# Altium footprint library Connectors.PcbLib: 245 footprints (part 3 of 18)
Each footprint in its own frame and in the unit in brackets; x right, y up, seen from the top. Pads: shape width x height; smd on the part's side, far side on the other; paste and mask are expansions set on the pad; w line width, h text height; cw(c..) or ccw(c..) is an arc to the next point about the centre after c.
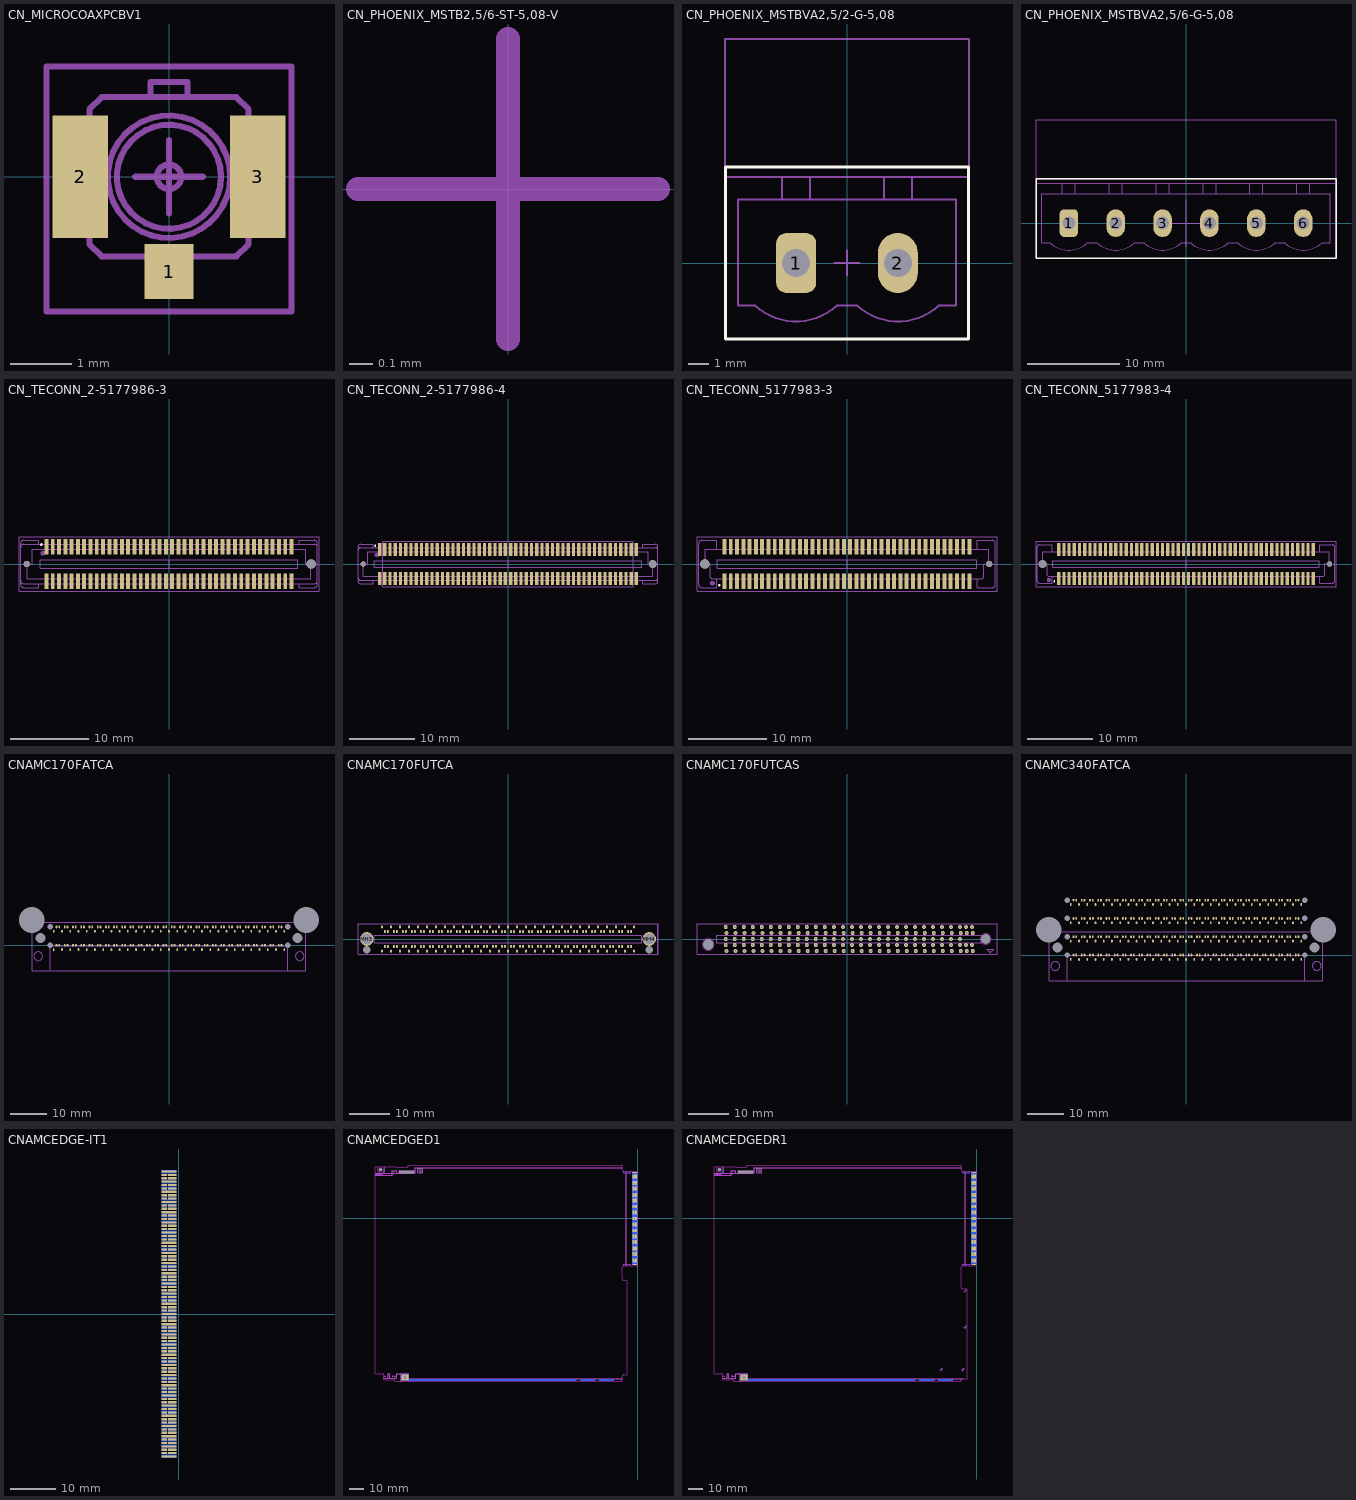
[diagram p2: the footprints below, top view; thin cyan lines are the x and y axes]

## CN_MICROCOAXPCBV1 [mm] "Micro coax pcb connector SMD"
height 2
pads (3):
  rect 0.8x0.9 smd: 1(0,-1.55)
  rect 0.9x2 smd: 2(-1.45,0) 3(1.45,0)
Mechanical 13:
  circle w0.1: c0,0 r0.2
  circle w0.1: c0,0 r1
  circle w0.1: c0,0 r0.85
  lines w0.1: -1.3,-0.9 -1.5,-0.9 -1.5,0.9 -1.3,0.9 ; -0.3,-1.3 -0.3,-1.55 0.3,-1.55 0.3,-1.3 ; -0.3,1.3 -0.3,1.55 0.3,1.55 0.3,1.3 ; 1.3,-0.9 1.5,-0.9 1.5,0.9 1.3,0.9 ; -1.3,-1.1 -1.3,1.1 -1.1,1.3 1.1,1.3 1.3,1.1 1.3,-1.1 1.1,-1.3 -1.1,-1.3 -1.3,-1.1
Mechanical 15:
  lines w0.102: -0.55,0 0.55,0 ; 0,-0.6 0,0.6 ; -2,-2.2 2,-2.2 2,1.8 -2,1.8 -2,-2.2
3D body: height 0.18, standoff 0, extent 1.3,-0.9 1.5,0.9
3D body: height 0.18, standoff 0, extent -1.5,-0.9 -1.3,0.9
3D body: height 1.25, standoff 0.35, extent -0.204,-0.204 0.204,0.204
3D body: height 1.25, standoff 0.35, extent -1.009,-1.009 1.009,1.009
3D body: height 0.35, standoff 0, extent -1.3,-1.3 1.3,1.3
3D body: height 0.18, standoff 0, extent -0.3,-1.55 0.3,-1.3
3D body: height 0.53, standoff 0.35, extent -0.3,0.95 0.3,1.55

## CN_PHOENIX_MSTB2,5/6-ST-5,08-V [mm] "MSTB2,5/5-ST-5,08  5pin PLUG vert"
Mechanical 15:
  lines w0.102: -0.635,0 0.635,0 ; 0,-0.635 0,0.635
3D body: height 21.95, standoff 3.75, extent -15.24,-3.8 15.24,11.2

## CN_PHOENIX_MSTBVA2,5/2-G-5,08 [mm] "MSTBVA2,5/2-G-5,08  2pin vertical"
pads (2):
  rrect50% 2x3 hole 1.4: 1(-2.54,0)
  oval 2x3 hole 1.4: 2(2.54,0)
Top Overlay:
  lines w0.15: -6.08,-3.8 -6.08,4.8 6.08,4.8 6.08,-3.8 -6.08,-3.8
Mechanical 13:
  lines w0.1: -6.1,4.3 6.096,4.3 ; -5.461,-2.125 -4.582,-2.125 ; -4.582,-2.132 ccw(c-2.55,0.075) -0.518,-2.132 ; -3.25,3.175 -3.25,4.3 ; -1.85,3.175 -1.85,4.3 ; -0.518,-2.125 0.518,-2.125 ; 0.518,-2.132 ccw(c2.55,0.075) 4.582,-2.132 ; 1.85,3.175 1.85,4.3 ; 3.25,3.175 3.25,4.3 ; 4.582,-2.125 5.461,-2.125 ; -3.04,-0.5 -3.04,0.5 -2.04,0.5 -2.04,-0.5 -3.04,-0.5 ; 2.04,-0.5 2.04,0.5 3.04,0.5 3.04,-0.5 2.04,-0.5
  lines w0.102: -5.461,-2.125 -5.461,3.175 5.461,3.175 5.461,-2.125 ; -6.08,-3.8 6.08,-3.8 6.08,4.8 -6.08,4.8 -6.08,-3.8
Mechanical 15:
  lines w0.1: -6.1,4.82 -6.1,11.2 6.1,11.2 6.1,4.82
  lines w0.102: -0.635,0 0.635,0 ; 0,-0.635 0,0.635
3D body: height 12.02, standoff -3.88, extent -6.08,-3.8 6.08,4.8

## CN_PHOENIX_MSTBVA2,5/6-G-5,08 [mm] "MSTBVA2,5/6-G-5,08  6pin vertical"
pads (6):
  rrect50% 2x3 hole 1.4: 1(-12.7,0)
  oval 2x3 hole 1.4: 2(-7.62,0) 3(-2.54,0) 4(2.54,0) 5(7.62,0) 6(12.7,0)
Top Overlay:
  lines w0.15: -16.256,-3.8 -16.256,4.8 16.256,4.8 16.256,-3.8 -16.256,-3.8
Mechanical 13:
  lines w0.1: -16.26,4.3 16.24,4.3 ; -15.621,-2.125 -14.742,-2.125 ; -14.742,-2.132 ccw(c-12.71,0.075) -10.678,-2.132 ; -13.41,3.175 -13.41,4.3 ; -12.01,3.175 -12.01,4.3 ; -10.678,-2.125 -9.642,-2.125 ; -9.642,-2.132 ccw(c-7.61,0.075) -5.578,-2.132 ; -8.31,3.175 -8.31,4.3 ; -6.91,3.175 -6.91,4.3 ; -5.598,-2.125 -4.562,-2.125 ; -4.562,-2.132 ccw(c-2.53,0.075) -0.498,-2.132 ; -3.23,3.175 -3.23,4.3 ; -1.83,3.175 -1.83,4.3 ; -0.518,-2.125 0.518,-2.125 ; 0.518,-2.132 ccw(c2.55,0.075) 4.582,-2.132 ; 1.85,3.175 1.85,4.3 ; 3.25,3.175 3.25,4.3 ; 4.562,-2.125 5.598,-2.125 ; 5.598,-2.132 ccw(c7.63,0.075) 9.662,-2.132 ; 6.93,3.175 6.93,4.3 ; 8.33,3.175 8.33,4.3 ; 9.642,-2.125 10.678,-2.125 ; 10.678,-2.132 ccw(c12.71,0.075) 14.742,-2.132 ; 12.01,3.175 12.01,4.3 ; 13.41,3.175 13.41,4.3 ; 14.742,-2.125 15.621,-2.125 ; -13.2,-0.5 -13.2,0.5 -12.2,0.5 -12.2,-0.5 -13.2,-0.5 ; -8.12,-0.5 -8.12,0.5 -7.12,0.5 -7.12,-0.5 -8.12,-0.5 ; -3.04,-0.5 -2.04,-0.5 -2.04,0.5 -3.04,0.5 -3.04,-0.5 ; 2.04,-0.5 2.04,0.5 3.04,0.5 3.04,-0.5 2.04,-0.5 ; 7.12,-0.5 8.12,-0.5 8.12,0.5 7.12,0.5 7.12,-0.5 ; 12.2,-0.5 12.2,0.5 13.2,0.5 13.2,-0.5 12.2,-0.5
  lines w0.102: -15.621,-2.125 -15.621,3.175 15.621,3.175 15.621,-2.125 ; -16.24,-3.8 16.24,-3.8 16.24,4.8 -16.24,4.8 -16.24,-3.8
Mechanical 15:
  lines w0.1: -16.256,4.82 -16.256,11.2 16.256,11.2 16.256,4.82
  lines w0.102: -1.905,0 1.905,0 ; 0,-2.54 0,2.54
3D body: height 12.02, standoff -3.88, extent -16.24,-3.8 16.24,4.8

## CN_TECONN_2-5177986-3 [mm] "0.8mm Pitch Stacking Height 6.6mm Header-Stacking Connector male"
height 6.6
pads (82):
  rect 0.5x2 smd: 1(-15.6,2.2) 2(-15.6,-2.2) 3(-14.8,2.2) 4(-14.8,-2.2) 5(-14,2.2) 6(-14,-2.2) 7(-13.2,2.2) 8(-13.2,-2.2) 9(-12.4,2.2) 10(-12.4,-2.2) 11(-11.6,2.2) 12(-11.6,-2.2) 13(-10.8,2.2) 14(-10.8,-2.2) 15(-10,2.2) 16(-10,-2.2) 17(-9.2,2.2) 18(-9.2,-2.2) 19(-8.4,2.2) 20(-8.4,-2.2) 21(-7.6,2.2) 22(-7.6,-2.2) 23(-6.8,2.2) 24(-6.8,-2.2) 25(-6,2.2) 26(-6,-2.2) 27(-5.2,2.2) 28(-5.2,-2.2) 29(-4.4,2.2) 30(-4.4,-2.2) 31(-3.6,2.2) 32(-3.6,-2.2) 33(-2.8,2.2) 34(-2.8,-2.2) 35(-2,2.2) 36(-2,-2.2) 37(-1.2,2.2) 38(-1.2,-2.2) 39(-0.4,2.2) 40(-0.4,-2.2) 41(0.4,2.2) 42(0.4,-2.2) 43(1.2,2.2) 44(1.2,-2.2) 45(2,2.2) 46(2,-2.2) 47(2.8,2.2) 48(2.8,-2.2) 49(3.6,2.2) 50(3.6,-2.2) 51(4.4,2.2) 52(4.4,-2.2) 53(5.2,2.2) 54(5.2,-2.2) 55(6,2.2) 56(6,-2.2) 57(6.8,2.2) 58(6.8,-2.2) 59(7.6,2.2) 60(7.6,-2.2) 61(8.4,2.2) 62(8.4,-2.2) 63(9.2,2.2) 64(9.2,-2.2) 65(10,2.2) 66(10,-2.2) 67(10.8,2.2) 68(10.8,-2.2) 69(11.6,2.2) 70(11.6,-2.2) 71(12.4,2.2) 72(12.4,-2.2) 73(13.2,2.2) 74(13.2,-2.2) 75(14,2.2) 76(14,-2.2) 77(14.8,2.2) 78(14.8,-2.2) 79(15.6,2.2) 80(15.6,-2.2)
  round 0.79 hole 0.8 unplated: MH1(-18.1,0)
  round 1.19 hole 1.2 unplated: MH2(18.1,0)
Top Overlay:
  circle w0.178: c-16.249,2.475 r0.074
Mechanical 13:
  circle w0.381: c-16.05,1.375 r0.125
  lines w0.1: -18.9,-2.1 ccw(c-18.5,-2.1) -18.5,-2.5 18.5,-2.5 ; -18.9,2.1 cw(c-18.5,2.1) -18.5,2.5 18.5,2.5 cw(c18.5,2.1) 18.9,2.1 ; -18.075,-1.9 18.075,-1.9 ; -17.4,1.9 17.4,1.9 ; -16.6,-2.5 -16.6,-3 -18.5,-3 cw(c-18.5,-2.6) -18.9,-2.6 -18.9,2.6 cw(c-18.5,2.6) -18.5,3 -16.6,3 -16.6,2.5 ; 16.4,-0.525 16.4,0.525 -16.4,0.525 -16.4,-0.525 16.4,-0.525 ; 16.6,-2.5 16.6,-3.001 18.5,-3.001 ccw(c18.5,-2.6) 18.9,-2.6 18.9,2.6 ccw(c18.5,2.6) 18.5,3 16.6,3 16.6,2.5 ; 18.5,-2.5 ccw(c18.5,-2.1) 18.9,-2.1
  lines w0.102: -18.075,-1.9 -18.075,0 -17.4,0 -17.4,1.9 ; 17.4,1.9 17.4,0 18.075,0 18.075,-1.9
Mechanical 15:
  lines w0.102: 0,-0.5 0,0.5 ; -19.1,-3.5 19.1,-3.5 19.1,3.5 -19.1,3.5 -19.1,-3.5
3D body: height 6.62, standoff -0.98, extent -18.9,-3 18.9,3

## CN_TECONN_2-5177986-4 [mm] "100pin 0.8mm Pitch Stacking Height 6.6mm Header-Stacking Connector male"
height 6.6
pads (102):
  rect 0.5x2 smd: 1(-19.6,2.2) 2(-19.6,-2.2) 3(-18.8,2.2) 4(-18.8,-2.2) 5(-18,2.2) 6(-18,-2.2) 7(-17.2,2.2) 8(-17.2,-2.2) 9(-16.4,2.2) 10(-16.4,-2.2) 11(-15.6,2.2) 12(-15.6,-2.2) 13(-14.8,2.2) 14(-14.8,-2.2) 15(-14,2.2) 16(-14,-2.2) 17(-13.2,2.2) 18(-13.2,-2.2) 19(-12.4,2.2) 20(-12.4,-2.2) 21(-11.6,2.2) 22(-11.6,-2.2) 23(-10.8,2.2) 24(-10.8,-2.2) 25(-10,2.2) 26(-10,-2.2) 27(-9.2,2.2) 28(-9.2,-2.2) 29(-8.4,2.2) 30(-8.4,-2.2) 31(-7.6,2.2) 32(-7.6,-2.2) 33(-6.8,2.2) 34(-6.8,-2.2) 35(-6,2.2) 36(-6,-2.2) 37(-5.2,2.2) 38(-5.2,-2.2) 39(-4.4,2.2) 40(-4.4,-2.2) 41(-3.6,2.2) 42(-3.6,-2.2) 43(-2.8,2.2) 44(-2.8,-2.2) 45(-2,2.2) 46(-2,-2.2) 47(-1.2,2.2) 48(-1.2,-2.2) 49(-0.4,2.2) 50(-0.4,-2.2) 51(0.4,2.2) 52(0.4,-2.2) 53(1.2,2.2) 54(1.2,-2.2) 55(2,2.2) 56(2,-2.2) 57(2.8,2.2) 58(2.8,-2.2) 59(3.6,2.2) 60(3.6,-2.2) 61(4.4,2.2) 62(4.4,-2.2) 63(5.2,2.2) 64(5.2,-2.2) 65(6,2.2) 66(6,-2.2) 67(6.8,2.2) 68(6.8,-2.2) 69(7.6,2.2) 70(7.6,-2.2) 71(8.4,2.2) 72(8.4,-2.2) 73(9.2,2.2) 74(9.2,-2.2) 75(10,2.2) 76(10,-2.2) 77(10.8,2.2) 78(10.8,-2.2) 79(11.6,2.2) 80(11.6,-2.2) 81(12.4,2.2) 82(12.4,-2.2) 83(13.2,2.2) 84(13.2,-2.2) 85(14,2.2) 86(14,-2.2) 87(14.8,2.2) 88(14.8,-2.2) 89(15.6,2.2) 90(15.6,-2.2) 91(16.4,2.2) 92(16.4,-2.2) 93(17.2,2.2) 94(17.2,-2.2) 95(18,2.2) 96(18,-2.2) 97(18.8,2.2) 98(18.8,-2.2) 99(19.6,2.2) 100(19.6,-2.2)
  round 0.79 hole 0.8 unplated: MH1(-22.1,0)
  round 1.19 hole 1.2 unplated: MH2(22.1,0)
Top Overlay:
  circle w0.178: c-20.274,2.8 r0.074
Mechanical 13:
  circle w0.381: c-20.05,1.375 r0.125
  lines w0.1: -22.9,-2.1 ccw(c-22.5,-2.1) -22.5,-2.5 22.5,-2.5 ccw(c22.5,-2.1) 22.9,-2.1 ; -22.9,2.1 cw(c-22.5,2.1) -22.5,2.5 22.5,2.5 cw(c22.5,2.1) 22.9,2.1 ; -22.5,-3 -20.6,-3 -20.6,-2.5 ; -22.5,-3 cw(c-22.5,-2.6) -22.9,-2.6 -22.9,2.6 cw(c-22.5,2.6) -22.5,3 -20.6,3 -20.6,2.5 ; -22.075,-1.9 22.075,-1.9 ; -21.4,1.9 21.4,1.9 ; 20.4,-0.525 20.4,0.525 -20.4,0.525 -20.4,-0.525 20.4,-0.525 ; 20.6,-2.5 20.6,-3.001 22.5,-3.001 ccw(c22.5,-2.601) 22.9,-2.601 22.9,2.6 ccw(c22.5,2.6) 22.5,3 20.6,3 20.6,2.5
  lines w0.102: -22.075,-1.9 -22.075,0 -21.4,0 -21.4,1.9 ; 21.4,1.9 21.4,0 22.075,0 22.075,-1.9
Mechanical 15:
  lines w0.102: 0,-0.5 0,0.5 ; -19.1,-3.5 -19.1,3.5 19.1,3.5 19.1,-3.5 -19.1,-3.5
3D body: height 6.62, standoff -0.98, extent -22.9,-3 22.9,3

## CN_TECONN_5177983-3 [mm] "0.8mm Pitch Stacking Height 6mm Header-Stacking Connector female"
height 6
pads (82):
  rect 0.5x2 smd: 1(-15.6,-2.2) 2(-15.6,2.2) 3(-14.8,-2.2) 4(-14.8,2.2) 5(-14,-2.2) 6(-14,2.2) 7(-13.2,-2.2) 8(-13.2,2.2) 9(-12.4,-2.2) 10(-12.4,2.2) 11(-11.6,-2.2) 12(-11.6,2.2) 13(-10.8,-2.2) 14(-10.8,2.2) 15(-10,-2.2) 16(-10,2.2) 17(-9.2,-2.2) 18(-9.2,2.2) 19(-8.4,-2.2) 20(-8.4,2.2) 21(-7.6,-2.2) 22(-7.6,2.2) 23(-6.8,-2.2) 24(-6.8,2.2) 25(-6,-2.2) 26(-6,2.2) 27(-5.2,-2.2) 28(-5.2,2.2) 29(-4.4,-2.2) 30(-4.4,2.2) 31(-3.6,-2.2) 32(-3.6,2.2) 33(-2.8,-2.2) 34(-2.8,2.2) 35(-2,-2.2) 36(-2,2.2) 37(-1.2,-2.2) 38(-1.2,2.2) 39(-0.4,-2.2) 40(-0.4,2.2) 41(0.4,-2.2) 42(0.4,2.2) 43(1.2,-2.2) 44(1.2,2.2) 45(2,-2.2) 46(2,2.2) 47(2.8,-2.2) 48(2.8,2.2) 49(3.6,-2.2) 50(3.6,2.2) 51(4.4,-2.2) 52(4.4,2.2) 53(5.2,-2.2) 54(5.2,2.2) 55(6,-2.2) 56(6,2.2) 57(6.8,-2.2) 58(6.8,2.2) 59(7.6,-2.2) 60(7.6,2.2) 61(8.4,-2.2) 62(8.4,2.2) 63(9.2,-2.2) 64(9.2,2.2) 65(10,-2.2) 66(10,2.2) 67(10.8,-2.2) 68(10.8,2.2) 69(11.6,-2.2) 70(11.6,2.2) 71(12.4,-2.2) 72(12.4,2.2) 73(13.2,-2.2) 74(13.2,2.2) 75(14,-2.2) 76(14,2.2) 77(14.8,-2.2) 78(14.8,2.2) 79(15.6,-2.2) 80(15.6,2.2)
  round 0.79 hole 0.8 unplated: MH1(18.1,0)
  round 1.19 hole 1.2 unplated: MH2(-18.1,0)
Top Overlay:
  circle w0.178: c-16.274,-2.725 r0.074
Mechanical 13:
  circle w0.381: c-17.125,-2.45 r0.125
  lines w0.1: 16.599,-1.9 16.599,-3 18.499,-3 ccw(c18.5,-2.6) 18.9,-2.6 18.9,2.6 ccw(c18.5,2.6) 18.5,3 16.6,3 16.6,1.9 -16.6,1.9 -16.6,3 -18.5,3 ccw(c-18.5,2.6) -18.9,2.6 -18.9,-2.6 ccw(c-18.5,-2.6) -18.5,-3 -16.6,-3 -16.6,-1.9 16.6,-1.9 ; -16.525,-0.525 -16.525,0.525 16.525,0.525 16.525,-0.525 -16.525,-0.525
  lines w0.102: -16.6,-1.9 -17.2,-1.9 -17.4,-1.7 -17.4,0 -18.075,0 -18.075,1.9 -16.6,1.9 ; 16.599,-1.9 17.199,-1.9 17.4,-1.7 17.4,0 18.075,0 18.075,1.9 16.6,1.9
Mechanical 15:
  lines w0.102: 0,-0.5 0,0.5 ; -19.1,-3.5 19.1,-3.5 19.1,3.5 -19.1,3.5 -19.1,-3.5
3D body: height 3.77, standoff -0.78, extent -18.9,-3 18.9,3

## CN_TECONN_5177983-4 [mm] "100pin 0.8mm Pitch Stacking Height 6mm Header-Stacking Connector female"
height 6
pads (102):
  rect 0.5x2 smd: 1(-19.6,-2.2) 2(-19.6,2.2) 3(-18.8,-2.2) 4(-18.8,2.2) 5(-18,-2.2) 6(-18,2.2) 7(-17.2,-2.2) 8(-17.2,2.2) 9(-16.4,-2.2) 10(-16.4,2.2) 11(-15.6,-2.2) 12(-15.6,2.2) 13(-14.8,-2.2) 14(-14.8,2.2) 15(-14,-2.2) 16(-14,2.2) 17(-13.2,-2.2) 18(-13.2,2.2) 19(-12.4,-2.2) 20(-12.4,2.2) 21(-11.6,-2.2) 22(-11.6,2.2) 23(-10.8,-2.2) 24(-10.8,2.2) 25(-10,-2.2) 26(-10,2.2) 27(-9.2,-2.2) 28(-9.2,2.2) 29(-8.4,-2.2) 30(-8.4,2.2) 31(-7.6,-2.2) 32(-7.6,2.2) 33(-6.8,-2.2) 34(-6.8,2.2) 35(-6,-2.2) 36(-6,2.2) 37(-5.2,-2.2) 38(-5.2,2.2) 39(-4.4,-2.2) 40(-4.4,2.2) 41(-3.6,-2.2) 42(-3.6,2.2) 43(-2.8,-2.2) 44(-2.8,2.2) 45(-2,-2.2) 46(-2,2.2) 47(-1.2,-2.2) 48(-1.2,2.2) 49(-0.4,-2.2) 50(-0.4,2.2) 51(0.4,-2.2) 52(0.4,2.2) 53(1.2,-2.2) 54(1.2,2.2) 55(2,-2.2) 56(2,2.2) 57(2.8,-2.2) 58(2.8,2.2) 59(3.6,-2.2) 60(3.6,2.2) 61(4.4,-2.2) 62(4.4,2.2) 63(5.2,-2.2) 64(5.2,2.2) 65(6,-2.2) 66(6,2.2) 67(6.8,-2.2) 68(6.8,2.2) 69(7.6,-2.2) 70(7.6,2.2) 71(8.4,-2.2) 72(8.4,2.2) 73(9.2,-2.2) 74(9.2,2.2) 75(10,-2.2) 76(10,2.2) 77(10.8,-2.2) 78(10.8,2.2) 79(11.6,-2.2) 80(11.6,2.2) 81(12.4,-2.2) 82(12.4,2.2) 83(13.2,-2.2) 84(13.2,2.2) 85(14,-2.2) 86(14,2.2) 87(14.8,-2.2) 88(14.8,2.2) 89(15.6,-2.2) 90(15.6,2.2) 91(16.4,-2.2) 92(16.4,2.2) 93(17.2,-2.2) 94(17.2,2.2) 95(18,-2.2) 96(18,2.2) 97(18.8,-2.2) 98(18.8,2.2) 99(19.6,-2.2) 100(19.6,2.2)
  round 0.79 hole 0.8 unplated: MH1(22.1,0)
  round 1.19 hole 1.2 unplated: MH2(-22.1,0)
Top Overlay:
  circle w0.178: c-20.274,-2.675 r0.074
Mechanical 13:
  circle w0.381: c-21.125,-2.45 r0.125
  lines w0.1: -22.9,-2.6 -22.9,2.6 ; -22.9,-2.6 ccw(c-22.5,-2.6) -22.5,-3 -20.6,-3 -20.6,-1.9 20.6,-1.9 20.6,-3 22.5,-3 ccw(c22.5,-2.6) 22.9,-2.6 22.9,2.6 ccw(c22.5,2.6) 22.5,3 20.6,3 20.6,1.9 -20.6,1.9 -20.6,3 -22.5,3 ccw(c-22.5,2.6) -22.9,2.6 ; -20.525,-0.525 -20.525,0.525 20.525,0.525 20.525,-0.525 -20.525,-0.525
  lines w0.102: -20.6,-1.9 -21.2,-1.9 -21.4,-1.7 -21.4,0 -22.075,0 -22.075,1.9 -20.6,1.9 ; 20.6,-1.9 21.199,-1.9 21.4,-1.7 21.4,0 22.075,0 22.075,1.9 20.6,1.9
Mechanical 15:
  lines w0.102: 0,-0.5 0,0.5 ; -23.1,-3.5 23.1,-3.5 23.1,3.5 -23.1,3.5 -23.1,-3.5
3D body: height 3.77, standoff -0.78, extent -22.9,-3 22.9,3

## CNAMC170FATCA [mm] "AMC ATCA 170 pin horizontal"
height 12.9
pads (178):
  oval 0.48x0.75 smd paste-1: 1(31.5,-1.2) 2(30.75,0) 3(30,0) 4(29.25,-1.2) 5(28.5,0) 6(27.75,0) 7(27,-1.2) 8(26.25,0) 9(25.5,0) 10(24.75,-1.2) 11(24,0) 12(23.25,0) 13(22.5,-1.2) 14(21.75,0) 15(21,0) 16(20.25,-1.2) 17(19.5,0) 18(18.75,0) 19(18,-1.2) 20(17.25,0) 21(16.5,0) 22(15.75,-1.2) 23(15,0) 24(14.25,0) 25(13.5,-1.2) 26(12.75,0) 27(12,0) 28(11.25,-1.2) 29(10.5,0) 30(9.75,0) 31(9,-1.2) 32(8.25,0) 33(7.5,0) 34(6.75,-1.2) 35(6.05,0) 36(5.25,0) 37(4.5,-1.2) 38(3.75,0) 39(3,0) 40(2.25,-1.2) 41(1.5,0) 42(0.75,0) 43(0,-1.2) 44(-0.75,0) 45(-1.5,0) 46(-2.25,-1.2) 47(-3,0) 48(-3.75,0) 49(-4.5,-1.2) 50(-5.25,0) 51(-6,0) 52(-6.75,-1.2) 53(-7.5,0) 54(-8.25,0) 55(-9,-1.2) 56(-9.75,0) 57(-10.5,0) 58(-11.25,-1.2) 59(-12,0) 60(-12.75,0) 61(-13.5,-1.2) 62(-14.25,0) 63(-15,0) 64(-15.75,-1.2) 65(-16.5,0) 66(-17.25,0) 67(-18,-1.2) 68(-18.75,0) 69(-19.5,0) 70(-20.25,-1.2) 71(-21,0) 72(-21.75,0) 73(-22.5,-1.2) 74(-23.25,0) 75(-24,0) 76(-24.75,-1.2) 77(-25.45,0) 78(-26.25,0) 79(-27,-1.2) 80(-27.75,0) 81(-28.5,0) 82(-29.25,-1.2) 83(-30,0) 84(-30.75,0) 85(-31.5,-1.2) 86(-31.5,3.8) 87(-30.75,5) 88(-30,5) 89(-29.25,3.8) 90(-28.5,5) 91(-27.75,5) 92(-27,3.8) 93(-26.25,5) 94(-25.5,5) 95(-24.75,3.8) 96(-24,5) 97(-23.25,5) 98(-22.5,3.8) 99(-21.75,5) 100(-21,5) 101(-20.25,3.8) 102(-19.5,5) 103(-18.75,5) 104(-18,3.8) 105(-17.25,5) 106(-16.5,5) 107(-15.75,3.8) 108(-15,5) 109(-14.25,5) 110(-13.5,3.8) 111(-12.75,5) 112(-12,5) 113(-11.25,3.8) 114(-10.5,5) 115(-9.75,5) 116(-9,3.8) 117(-8.25,5) 118(-7.5,5) 119(-6.75,3.8) 120(-6,5) 121(-5.25,5) 122(-4.5,3.8) 123(-3.75,5) 124(-3,5) 125(-2.25,3.8) 126(-1.5,5) 127(-0.75,5) 128(-0.025,3.8) 129(0.75,5) 130(1.5,5) 131(2.25,3.8) 132(3,5) 133(3.75,5) 134(4.5,3.8) 135(5.25,5) 136(6,5) 137(6.75,3.8) 138(7.5,5) 139(8.25,5) 140(9,3.8) 141(9.75,5) 142(10.5,5) 143(11.25,3.8) 144(12,5) 145(12.75,5) 146(13.5,3.8) 147(14.25,5) 148(15,5) 149(15.75,3.8) 150(16.5,5) 151(17.25,5) 152(18,3.8) 153(18.75,5) 154(19.5,5) 155(20.25,3.8) 156(21,5) 157(21.75,5) 158(22.5,3.8) 159(23.25,5) 160(24,5) 161(24.75,3.8) 162(25.5,5) 163(26.25,5) 164(27,3.8) 165(27.75,5) 166(28.5,5) 167(29.25,3.8) 168(30,5) 169(30.75,5) 170(31.5,3.8)
  round 0 hole 1.5 unplated mask+0.2: MH1(-32.5,0) MH2(32.5,0) MH3(-32.5,5) MH4(32.5,5)
  round 0 hole 2.7 unplated mask+0.2: MH5(-35.15,2) MH6(35.15,2)
  round 0 hole 7 unplated mask+0.3: MH7(37.5,6.9) MH8(-37.5,6.9)
Mechanical 13:
  circle w0.1: c-35.75,-3 r1.2
  circle w0.1: c35.75,-3 r1.2
  lines w0.1: -37.401,3.652 ccw(c-37.5,6.9) -37.4,10.148 ; -37.4,5.55 -37.4,-7 37.4,-7 37.4,5.55 ; -37.4,5.554 ccw(c-37.5,6.9) -37.4,8.246 ; -37.4,8.25 -37.4,10.15 ; -34.3,6.3 34.3,6.3 ; 37.4,3.652 cw(c37.5,6.9) 37.4,10.148 ; 37.4,5.554 cw(c37.5,6.9) 37.4,8.246 ; 37.4,8.25 37.4,10.15
Mechanical 15:
  lines w0.1: -32.5,-7 -32.5,-0.1 32.5,-0.1 32.5,-7
  text "DAUGHTER BOARD" at -5.95,-1.3 h0.8
3D body: height 22.5, standoff 21.85, extent 34.55,-4.2 36.95,-1.8
3D body: height 8.25, standoff -5.8, extent -37.4,3.675 -34.25,10.148
3D body: height 17, standoff 0, extent -37.401,-7 37.4,6.3
3D body: height 8.25, standoff -5.8, extent 34.25,3.679 37.401,10.152
3D body: height 22.5, standoff 21.85, extent -36.95,-4.2 -34.55,-1.8
3D body: height 18.9, standoff 17, extent -37.401,-7 37.4,6.3
3D body: height 21.85, standoff 18.9, extent -37.401,-7 37.4,6.3

## CNAMC170FUTCA [mm] "AMC uTCA 170 pin vertical"
height 12.9
pads (174):
  oval 0.48x0.75 smd paste-1: 1(31.5,-3.05) 2(30.75,-1.85) 3(30,-1.85) 4(29.25,-3.05) 5(28.5,-1.85) 6(27.75,-1.85) 7(27,-3.05) 8(26.25,-1.85) 9(25.5,-1.85) 10(24.75,-3.05) 11(24,-1.85) 12(23.25,-1.85) 13(22.5,-3.05) 14(21.75,-1.85) 15(21,-1.85) 16(20.25,-3.05) 17(19.5,-1.85) 18(18.75,-1.85) 19(18,-3.05) 20(17.25,-1.85) 21(16.5,-1.85) 22(15.75,-3.05) 23(15,-1.85) 24(14.25,-1.85) 25(13.5,-3.05) 26(12.75,-1.85) 27(12,-1.85) 28(11.25,-3.05) 29(10.5,-1.85) 30(9.75,-1.85) 31(9,-3.05) 32(8.25,-1.85) 33(7.5,-1.85) 34(6.75,-3.05) 35(6.05,-1.85) 36(5.25,-1.85) 37(4.5,-3.05) 38(3.75,-1.85) 39(3,-1.85) 40(2.25,-3.05) 41(1.5,-1.85) 42(0.75,-1.85) 43(0,-3.05) 44(-0.75,-1.85) 45(-1.5,-1.85) 46(-2.25,-3.05) 47(-3,-1.85) 48(-3.75,-1.85) 49(-4.5,-3.05) 50(-5.25,-1.85) 51(-6,-1.85) 52(-6.75,-3.05) 53(-7.5,-1.85) 54(-8.25,-1.85) 55(-9,-3.05) 56(-9.75,-1.85) 57(-10.5,-1.85) 58(-11.25,-3.05) 59(-12,-1.85) 60(-12.75,-1.85) 61(-13.5,-3.05) 62(-14.25,-1.85) 63(-15,-1.85) 64(-15.75,-3.05) 65(-16.5,-1.85) 66(-17.25,-1.85) 67(-18,-3.05) 68(-18.75,-1.85) 69(-19.5,-1.85) 70(-20.25,-3.05) 71(-21,-1.85) 72(-21.75,-1.85) 73(-22.5,-3.05) 74(-23.25,-1.85) 75(-24,-1.85) 76(-24.75,-3.05) 77(-25.45,-1.85) 78(-26.25,-1.85) 79(-27,-3.05) 80(-27.75,-1.85) 81(-28.5,-1.85) 82(-29.25,-3.05) 83(-30,-1.85) 84(-30.75,-1.85) 85(-31.5,-3.05) 86(-31.5,3.05) 87(-30.75,1.85) 88(-30,1.85) 89(-29.25,3.05) 90(-28.5,1.85) 91(-27.75,1.85) 92(-27,3.05) 93(-26.25,1.85) 94(-25.5,1.85) 95(-24.75,3.05) 96(-24,1.85) 97(-23.25,1.85) 98(-22.5,3.05) 99(-21.75,1.85) 100(-21,1.85) 101(-20.25,3.05) 102(-19.5,1.85) 103(-18.75,1.85) 104(-18,3.05) 105(-17.25,1.85) 106(-16.5,1.85) 107(-15.75,3.05) 108(-15,1.85) 109(-14.25,1.85) 110(-13.5,3.05) 111(-12.75,1.85) 112(-12,1.85) 113(-11.25,3.05) 114(-10.5,1.85) 115(-9.75,1.85) 116(-9,3.05) 117(-8.25,1.85) 118(-7.5,1.85) 119(-6.75,3.05) 120(-6,1.85) 121(-5.25,1.85) 122(-4.5,3.05) 123(-3.75,1.85) 124(-3,1.85) 125(-2.25,3.05) 126(-1.5,1.85) 127(-0.75,1.85) 128(0,3.05) 129(0.75,1.85) 130(1.5,1.85) 131(2.25,3.05) 132(3,1.85) 133(3.75,1.85) 134(4.5,3.05) 135(5.25,1.85) 136(6,1.85) 137(6.75,3.05) 138(7.5,1.85) 139(8.25,1.85) 140(9,3.05) 141(9.75,1.85) 142(10.5,1.85) 143(11.25,3.05) 144(12,1.85) 145(12.75,1.85) 146(13.5,3.05) 147(14.25,1.85) 148(15,1.85) 149(15.75,3.05) 150(16.5,1.85) 151(17.25,1.85) 152(18,3.05) 153(18.75,1.85) 154(19.5,1.85) 155(20.25,3.025) 156(21,1.85) 157(21.75,1.85) 158(22.5,3.05) 159(23.25,1.85) 160(24,1.85) 161(24.75,3.05) 162(25.5,1.85) 163(26.25,1.85) 164(27,3.05) 165(27.75,1.85) 166(28.5,1.85) 167(29.25,3.05) 168(30,1.85) 169(30.75,1.85) 170(31.5,3.05)
  round 0 hole 1.8 unplated mask+1: MH1(-35.25,-2.7) MH2(35.25,-2.7)
  round 3.4 hole 2.8: MH3(-35.25,0) MH4(35.25,0)
Mechanical 13:
  lines w0.1: -37.4,-3.75 37.4,-3.75 ; -37.4,3.75 37.4,3.75 ; -33.401,-0.95 33.401,-0.95 33.401,0.95 -33.401,0.95 -33.401,-0.95
  lines w0.102: -37.4,-3.75 -37.4,3.75 ; 37.4,-3.75 37.4,3.75
Mechanical 14:
  lines w0.102: -37.45,-3.75 37.45,-3.75 37.45,3.75 -37.45,3.75 -37.45,-3.75
3D body: height 12.6, standoff 3.5, extent -37.4,-3.75 37.4,0
3D body: height 12.6, standoff 3.5, extent -37.4,0 37.4,3.75
3D body: height 3.5, standoff 0, extent -37.4,-3.75 37.4,3.75
3D body: height 12, standoff 3, extent -33.401,0.686 33.401,0.95
3D body: height 0, standoff -1.44, extent -36.152,-3.589 -34.359,-1.796
3D body: height 0, standoff -1.44, extent 34.348,-3.589 36.141,-1.796
3D body: height 13, standoff -6.8, extent -36.613,-1.358 -33.872,1.358
3D body: height 13, standoff -6.8, extent 33.887,-1.358 36.628,1.358
3D body: height 12, standoff 3, extent -33.401,-0.95 33.401,-0.686
3D body: height -3.3, standoff -6.4, extent -37.45,-3.75 37.45,3.75
